# Altium footprint library BASIC.PcbLib: 244 footprints (part 12 of 16)
Each footprint in its own frame and in the unit in brackets; x right, y up, seen from the top. Pads: shape width x height; smd on the part's side, far side on the other; paste and mask are expansions set on the pad; w line width, h text height; cw(c..) or ccw(c..) is an arc to the next point about the centre after c.
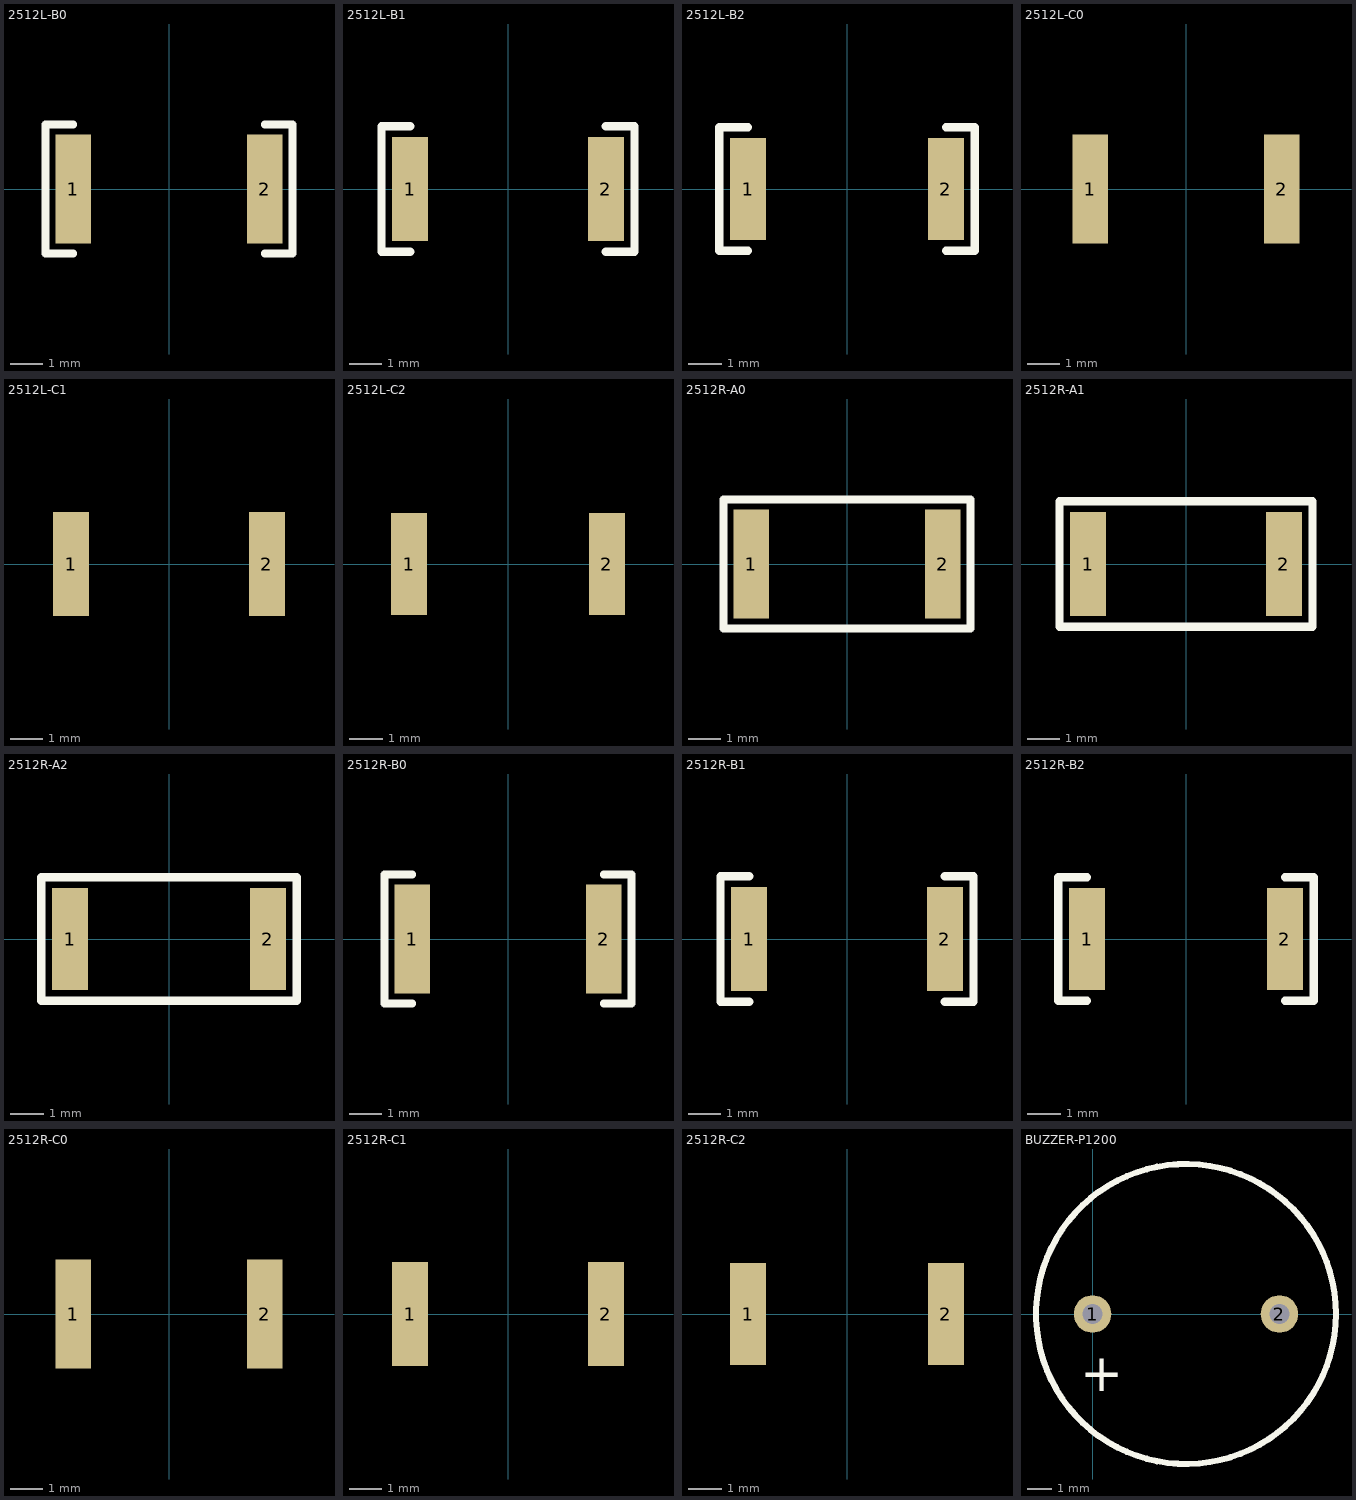
[diagram p11: the footprints below, top view; thin cyan lines are the x and y axes]

## 2512L-B0 [mm]
height 0.7
pads (2):
  rect 1.1x3.4 smd: 1(-3,0) 2(3,0)
Top Overlay:
  lines w0.25: -3,-2.025 -3.875,-2.025 -3.875,2.025 -3,2.025 ; 3,-2.025 3.875,-2.025 3.875,2.025 3,2.025
3D body "RES2512.STEP": height 0.62, standoff 0, extent -3.16,-1.6 3.16,1.6

## 2512L-B1 [mm]
height 0.7
pads (2):
  rect 1.1x3.2 smd: 1(-3,0) 2(3,0)
Top Overlay:
  lines w0.25: -3,-1.925 -3.875,-1.925 -3.875,1.925 -3,1.925 ; 3,-1.925 3.875,-1.925 3.875,1.925 3,1.925
3D body "RES2512.STEP": height 0.62, standoff 0, extent -3.16,-1.6 3.16,1.6

## 2512L-B2 [mm]
height 0.7
pads (2):
  rect 1.1x3.1 smd: 1(-3,0) 2(3,0)
Top Overlay:
  lines w0.25: -3,-1.875 -3.875,-1.875 -3.875,1.875 -3,1.875 ; 3,-1.875 3.875,-1.875 3.875,1.875 3,1.875
3D body "RES2512.STEP": height 0.62, standoff 0, extent -3.16,-1.6 3.16,1.6

## 2512L-C0 [mm]
height 0.7
pads (2):
  rect 1.1x3.4 smd: 1(-3,0) 2(3,0)
3D body "RES2512.STEP": height 0.62, standoff 0, extent -3.16,-1.6 3.16,1.6

## 2512L-C1 [mm]
height 0.7
pads (2):
  rect 1.1x3.2 smd: 1(-3,0) 2(3,0)
3D body "RES2512.STEP": height 0.62, standoff 0, extent -3.16,-1.6 3.16,1.6

## 2512L-C2 [mm]
height 0.7
pads (2):
  rect 1.1x3.1 smd: 1(-3,0) 2(3,0)
3D body "RES2512.STEP": height 0.62, standoff 0, extent -3.16,-1.6 3.16,1.6

## 2512R-A0 [mm]
height 0.7
pads (2):
  rect 1.1x3.4 smd: 1(-3,0) 2(3,0)
Top Overlay:
  lines w0.25: -3.875,-2.025 -3.875,2.025 3.875,2.025 3.875,-2.025 -3.875,-2.025
3D body "RES2512.STEP": height 0.62, standoff 0, extent -3.16,-1.6 3.16,1.6

## 2512R-A1 [mm]
height 0.7
pads (2):
  rect 1.1x3.2 smd: 1(-3,0) 2(3,0)
Top Overlay:
  lines w0.25: -3.875,-1.925 -3.875,1.925 3.875,1.925 3.875,-1.925 -3.875,-1.925
3D body "RES2512.STEP": height 0.62, standoff 0, extent -3.16,-1.6 3.16,1.6

## 2512R-A2 [mm]
height 0.7
pads (2):
  rect 1.1x3.1 smd: 1(-3,0) 2(3,0)
Top Overlay:
  lines w0.25: -3.875,-1.875 3.875,-1.875 3.875,1.875 -3.875,1.875 -3.875,-1.875
3D body "RES2512.STEP": height 0.62, standoff 0, extent -3.16,-1.6 3.16,1.6

## 2512R-B0 [mm]
height 0.7
pads (2):
  rect 1.1x3.4 smd: 1(-3,0) 2(3,0)
Top Overlay:
  lines w0.25: -3,-2.025 -3.875,-2.025 -3.875,2.025 -3,2.025 ; 3,-2.025 3.875,-2.025 3.875,2.025 3,2.025
3D body "RES2512.STEP": height 0.62, standoff 0, extent -3.16,-1.6 3.16,1.6

## 2512R-B1 [mm]
height 0.7
pads (2):
  rect 1.1x3.2 smd: 1(-3,0) 2(3,0)
Top Overlay:
  lines w0.25: -3,-1.925 -3.875,-1.925 -3.875,1.925 -3,1.925 ; 3,-1.925 3.875,-1.925 3.875,1.925 3,1.925
3D body "RES2512.STEP": height 0.62, standoff 0, extent -3.16,-1.6 3.16,1.6

## 2512R-B2 [mm]
height 0.7
pads (2):
  rect 1.1x3.1 smd: 1(-3,0) 2(3,0)
Top Overlay:
  lines w0.25: -3,-1.875 -3.875,-1.875 -3.875,1.875 -3,1.875 ; 3,-1.875 3.875,-1.875 3.875,1.875 3,1.875
3D body "RES2512.STEP": height 0.62, standoff 0, extent -3.16,-1.6 3.16,1.6

## 2512R-C0 [mm]
height 0.7
pads (2):
  rect 1.1x3.4 smd: 1(-3,0) 2(3,0)
3D body "RES2512.STEP": height 0.62, standoff 0, extent -3.16,-1.6 3.16,1.6

## 2512R-C1 [mm]
height 0.7
pads (2):
  rect 1.1x3.2 smd: 1(-3,0) 2(3,0)
3D body "RES2512.STEP": height 0.62, standoff 0, extent -3.16,-1.6 3.16,1.6

## 2512R-C2 [mm]
height 0.7
pads (2):
  rect 1.1x3.1 smd: 1(-3,0) 2(3,0)
3D body "RES2512.STEP": height 0.62, standoff 0, extent -3.16,-1.6 3.16,1.6

## BUZZER-P1200 [mil]
height 393.7
pads (2):
  round 60 hole 31.5: 1(0,0) 2(299.21,0)
Top Overlay:
  circle w9.84: c149.61,0 r240.16
  text "+" at -19.68,-124.02 h60
3D body "SW3dPS-WST-1203UX.STEP": height 379.92, standoff -177.17, extent -222.21,-235.83 386.22,236.62